# Altium footprint library Connectors.PcbLib: 131 footprints (part 7 of 9)
Each footprint in its own frame and in the unit in brackets; x right, y up, seen from the top. Pads: shape width x height; smd on the part's side, far side on the other; paste and mask are expansions set on the pad; w line width, h text height; cw(c..) or ccw(c..) is an arc to the next point about the centre after c.
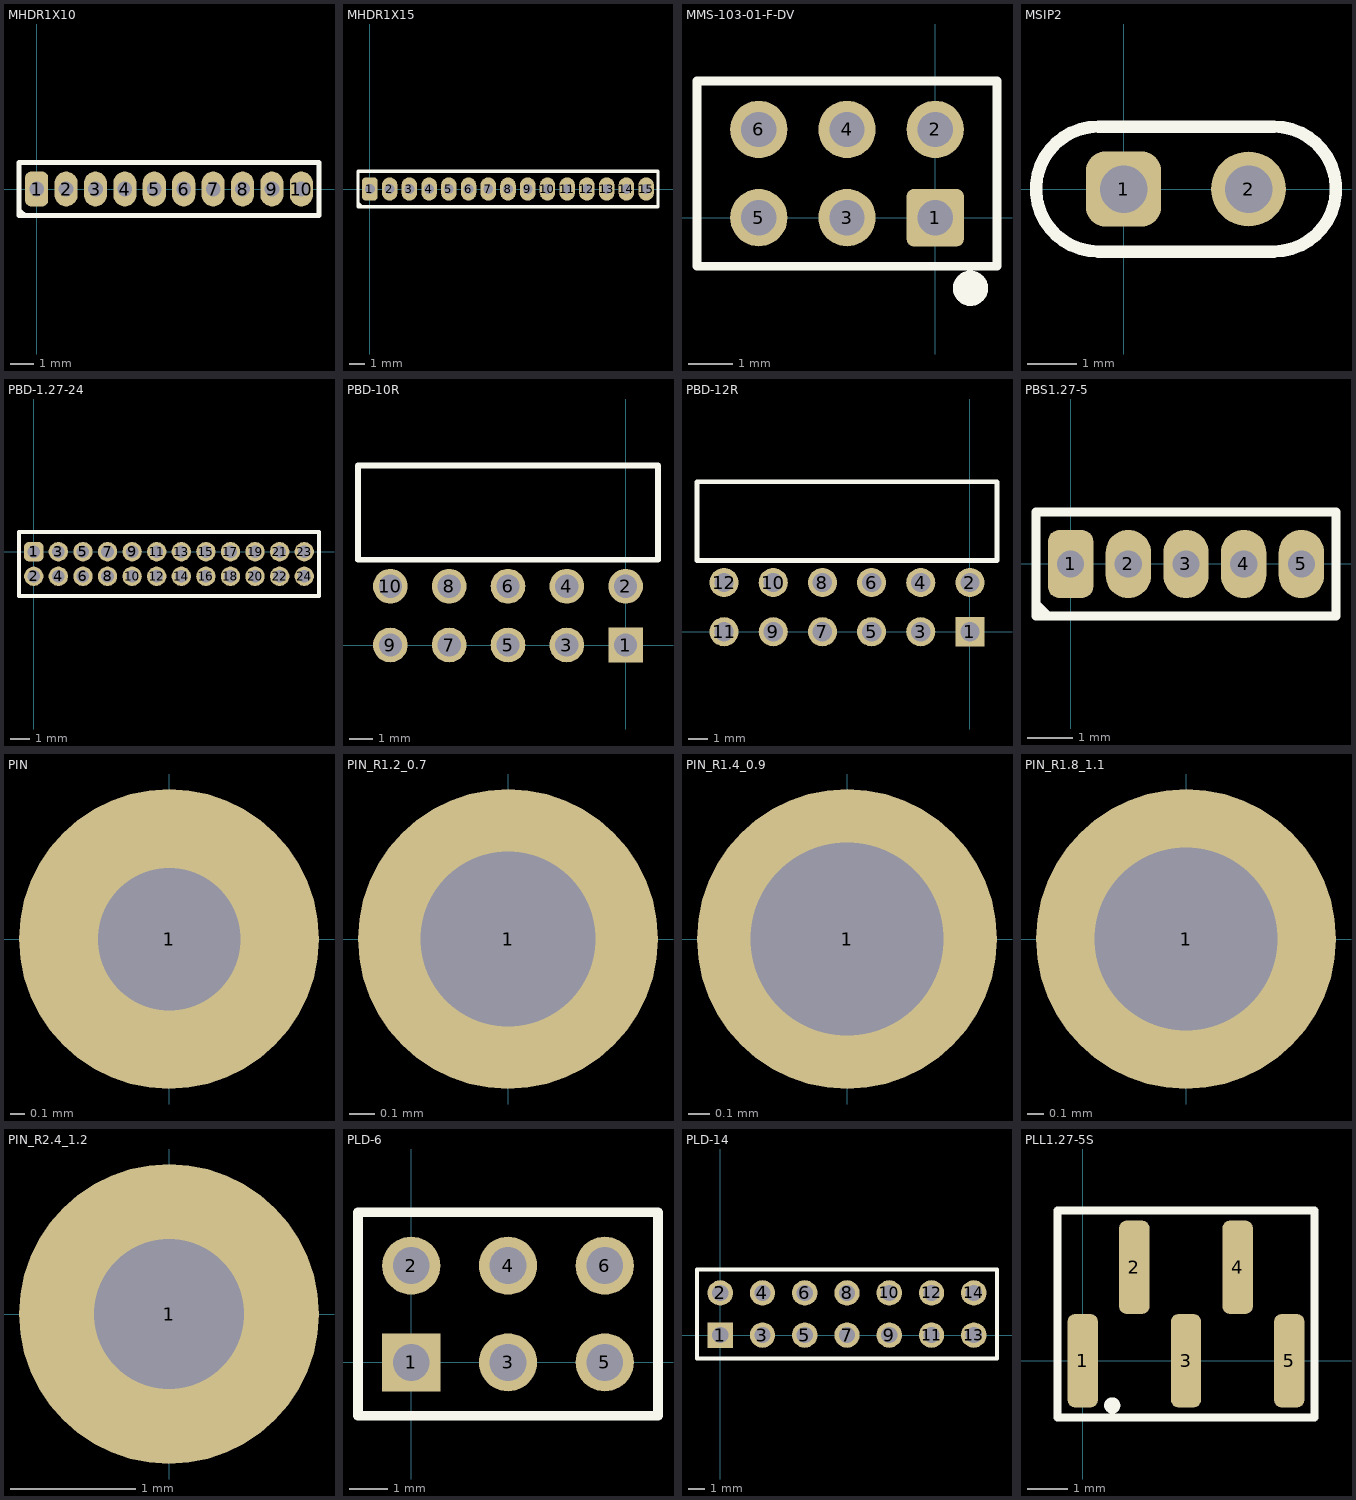
[diagram p6: the footprints below, top view; thin cyan lines are the x and y axes]

## MHDR1X10 [mm]
pads (10):
  rrect50% 1x1.5 hole 0.635: 1(0,0)
  oval 1x1.5 hole 0.635: 2(1.27,0) 3(2.54,0) 4(3.81,0) 5(5.08,0) 6(6.35,0) 7(7.62,0) 8(8.89,0) 9(10.16,0) 10(11.43,0)
Top Overlay:
  lines w0.203: -0.762,-0.889 -0.55,-1.101 ; -0.762,-1.143 -0.762,1.143 12.192,1.143 12.192,-1.143 -0.762,-1.143
Top Assembly:
  text ".Designator" at 0.717,-0.333 h1
3D body "Samtec-FTS-105-01-F-S.step": height 3.91, standoff -2.29, extent -0.625,-1.075 5.725,1.084
3D body "Samtec-FTS-105-01-F-S.step": height 3.91, standoff -2.29, extent 5.725,-1.075 12.075,1.084

## MHDR1X15 [mm]
pads (15):
  rrect50% 1x1.5 hole 0.635: 1(0,0)
  oval 1x1.5 hole 0.635: 2(1.27,0) 3(2.54,0) 4(3.81,0) 5(5.08,0) 6(6.35,0) 7(7.62,0) 8(8.89,0) 9(10.16,0) 10(11.43,0) 11(12.7,0) 12(13.97,0) 13(15.24,0) 14(16.51,0) 15(17.78,0)
Top Overlay:
  lines w0.203: -0.762,-0.889 -0.55,-1.101 ; -0.762,-1.143 18.542,-1.143 18.542,1.143 -0.762,1.143 -0.762,-1.143
Top Assembly:
  text ".Designator" at 3.892,-0.333 h1
3D body "Samtec-FTS-105-01-F-S.step": height 3.91, standoff -2.29, extent 5.725,-1.075 12.075,1.084
3D body "Samtec-FTS-105-01-F-S.step": height 3.91, standoff -2.29, extent -0.625,-1.075 5.725,1.084
3D body "Samtec-FTS-105-01-F-S.step": height 3.91, standoff -2.29, extent 12.075,-1.075 18.425,1.084

## MMS-103-01-F-DV [mm]
pads (6):
  rrect25% 1.3x1.3 hole 0.8: 1(0,0)
  round 1.3 hole 0.8: 2(0,2) 3(-2,0) 4(-2,2) 5(-4,0) 6(-4,2)
Top Overlay:
  circle w0.4: c0.8,-1.6 r0.2
  lines w0.2: -5.4,-1.1 -5.4,3.1 1.4,3.1 1.4,-1.1 -5.4,-1.1
Top Assembly:
  text ".Designator" at -6.998,0.667 h1
3D body "Samtec-MMS-103-01-F-DV.STEP": height 4.44, standoff -2.92, extent -5.284,-1 1.284,3

## MSIP2 [mil]
pads (2):
  rrect50% 60x60 hole 38: 1(0,0)
  round 60 hole 38: 2(100,0)
Top Overlay:
  lines w10: -20,-50 cw(c-20,0) -20,50 120,50 cw(c120,0) 120,-50 -20,-50
Top Assembly:
  text ".Designator" at 246.79,-13.12 h39.37

## PBD-1.27-24 [mm]
pads (24):
  rrect50% 1x1 hole 0.65: 1(0,0)
  round 1 hole 0.65: 2(0,-1.27) 3(1.27,0) 4(1.27,-1.27) 5(2.54,0) 6(2.54,-1.27) 7(3.81,0) 8(3.81,-1.27) 9(5.08,0) 10(5.08,-1.27) 11(6.35,0) 12(6.35,-1.27) 13(7.62,0) 14(7.62,-1.27) 15(8.89,0) 16(8.89,-1.27) 17(10.16,0) 18(10.16,-1.27) 19(11.43,0) 20(11.43,-1.27) 21(12.7,0) 22(12.7,-1.27) 23(13.97,0) 24(13.97,-1.27)
Top Overlay:
  lines w0.203: -0.762,-2.286 14.732,-2.286 14.732,1.016 -0.762,1.016 -0.762,-2.286
Top Assembly:
  text ".Designator" at 1.987,-0.968 h1
3D body "User Library-PBD1_27-24.STEP": height 4.54, standoff -2.56, extent -0.635,-2.135 14.605,0.865

## PBD-10R [mm]
pads (10):
  rect 1.5x1.5 hole 1: 1(0,0)
  round 1.5 hole 1: 2(0,2.54) 3(-2.54,0) 4(-2.54,2.54) 5(-5.08,0) 6(-5.08,2.54) 7(-7.62,0) 8(-7.62,2.54) 9(-10.16,0) 10(-10.16,2.54)
Top Overlay:
  lines w0.254: -11.557,3.683 1.397,3.683 1.397,7.747 -11.557,7.747 -11.557,3.683
Top Assembly:
  text ".Designator" at -10.078,5.382 h1
3D body "User Library-PBD-10R.STEP": height 5.05, standoff -3.45, extent -11.43,-0.204 1.27,12.396

## PBD-12R [mm]
pads (12):
  rect 1.5x1.5 hole 1: 1(0,0)
  round 1.5 hole 1: 2(0,2.54) 3(-2.54,0) 4(-2.54,2.54) 5(-5.08,0) 6(-5.08,2.54) 7(-7.62,0) 8(-7.62,2.54) 9(-10.16,0) 10(-10.16,2.54) 11(-12.7,0) 12(-12.7,2.54)
Top Overlay:
  lines w0.254: -14.097,3.683 1.397,3.683 1.397,7.747 -14.097,7.747 -14.097,3.683
Top Assembly:
  text ".Designator" at -11.348,5.382 h1
3D body "User Library-PBD-6R.STEP": height 5.04, standoff -3.46, extent -13.97,-0.204 -6.35,12.396
3D body "User Library-PBD-6R.STEP": height 5.04, standoff -3.46, extent -6.35,-0.204 1.27,12.396

## PBS1.27-5 [mm]
pads (5):
  rrect50% 1x1.5 hole 0.6: 1(0,0)
  oval 1x1.5 hole 0.6: 2(1.27,0) 3(2.54,0) 4(3.81,0) 5(5.08,0)
Top Overlay:
  lines w0.203: -0.72,-0.931 -0.508,-1.143 ; -0.762,-1.143 -0.762,1.143 5.842,1.143 5.842,-1.143 -0.762,-1.143
Top Assembly:
  text ".Designator" at -2.458,-0.333 h1
3D body "PBS1.27-5.step": height 4.4, standoff -2.3, extent -0.635,-0.9 5.715,0.9

## PIN [mil]
pads (1):
  round 80 hole 38: 1(0,0)
Top Assembly:
  text ".Designator" at 55.12,-13.12 h39.37

## PIN_R1.2_0.7 [mm]
pads (1):
  round 1.2 hole 0.7: 1(0,0)
Top Assembly:
  text ".Designator" at 1,-0.333 h1

## PIN_R1.4_0.9 [mm]
pads (1):
  round 1.4 hole 0.9: 1(0,0)
Top Assembly:
  text ".Designator" at 1.1,-0.333 h1

## PIN_R1.8_1.1 [mm]
pads (1):
  round 1.8 hole 1.1: 1(0,0)
Top Assembly:
  text ".Designator" at 1.6,-0.333 h1

## PIN_R2.4_1.2 [mm]
pads (1):
  round 2.4 hole 1.2: 1(0,0)
Top Assembly:
  text ".Designator" at 1.6,-0.333 h1

## PLD-6 [mil]
pads (6):
  rect 60x60 hole 38: 1(0,0)
  round 60 hole 38: 2(0,100) 3(100,0) 4(100,100) 5(200,0) 6(200,100)
Top Overlay:
  lines w10: -55,-55 -55,155 255,155 255,-55 -55,-55
Top Assembly:
  text ".Designator" at -96.79,36.88 h39.37
3D body "User Library-PLD-xxPLD-6.STEP": height 330.71, standoff -118.11, extent -50,-48.23 250,148.62

## PLD-14 [mil]
pads (14):
  rect 60x60 hole 38: 1(0,0)
  round 60 hole 38: 2(0,100) 3(100,0) 4(100,100) 5(200,0) 6(200,100) 7(300,0) 8(300,100) 9(400,0) 10(400,100) 11(500,0) 12(500,100) 13(600,0) 14(600,100)
Top Overlay:
  lines w10: -55,-55 655,-55 655,155 -55,155 -55,-55
Top Assembly:
  text ".Designator" at 103.21,36.88 h39.37
3D body "User Library-PLD-xxPLD-14.STEP": height 330.71, standoff -118.11, extent -50.39,-48.23 649.61,148.62

## PLL1.27-5S [mm]
pads (5):
  rrect50% 0.75x2.3 smd: 1(0,0) 2(1.27,2.3) 3(2.54,0) 4(3.81,2.3) 5(5.08,0)
Top Overlay:
  circle w0.254: c0.725,-1.1 r0.071
  lines w0.2: -0.625,-1.4 5.7,-1.4 5.7,3.7 -0.625,3.7 -0.625,-1.4
Top Assembly:
  text ".Designator" at -2.458,0.937 h1
3D body "PLL1.27-5S.STEP": height 6.1, standoff 0, extent -0.625,-0.62 5.725,2.92